# Altium footprint library IC.PCBLIB: 359 footprints (part 6 of 23)
Each footprint in its own frame and in the unit in brackets; x right, y up, seen from the top. Pads: shape width x height; smd on the part's side, far side on the other; paste and mask are expansions set on the pad; w line width, h text height; cw(c..) or ccw(c..) is an arc to the next point about the centre after c.
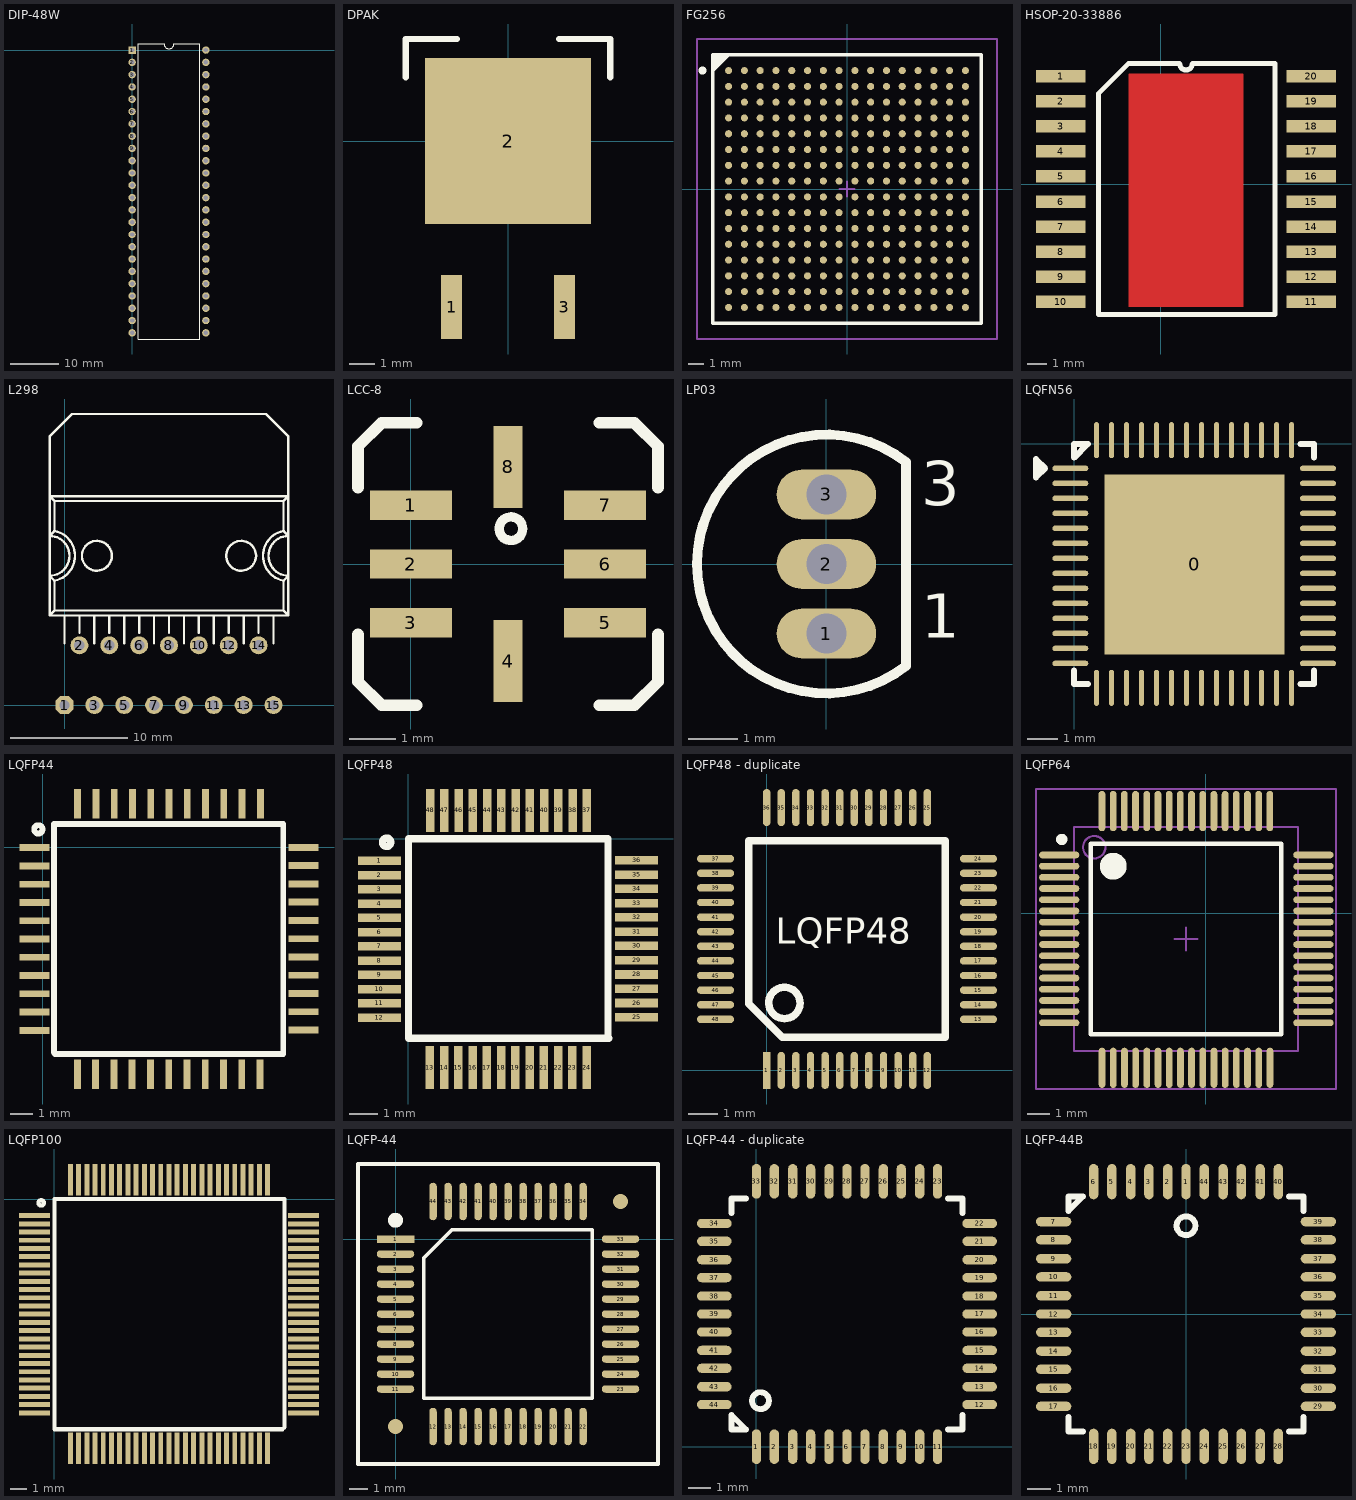
[diagram p5: the footprints below, top view; thin cyan lines are the x and y axes]

## DIP-48W [mil]
pads (48):
  rect 60x60 hole 35: 1(0,0)
  round 60 hole 35: 2(0,-100) 3(0,-200) 4(0,-300) 5(0,-400) 6(0,-500) 7(0,-600) 8(0,-700) 9(0,-800) 10(0,-900) 11(0,-1000) 12(0,-1100) 13(0,-1200) 14(0,-1300) 15(0,-1400) 16(0,-1500) 17(0,-1600) 18(0,-1700) 19(0,-1800) 20(0,-1900) 21(0,-2000) 22(0,-2100) 23(0,-2200) 24(0,-2300) 25(600,-2300) 26(600,-2200) 27(600,-2100) 28(600,-2000) 29(600,-1900) 30(600,-1800) 31(600,-1700) 32(600,-1600) 33(600,-1500) 34(600,-1400) 35(600,-1300) 36(600,-1200) 37(600,-1100) 38(600,-1000) 39(600,-900) 40(600,-800) 41(600,-700) 42(600,-600) 43(600,-500) 44(600,-400) 45(600,-300) 46(600,-200) 47(600,-100) 48(600,0)
TopOverlay:
  lines w10: 50,-2350 50,50 260,50 ccw(c300,50) 340,50 550,50 550,-2350 50,-2350

## DPAK [mil]
pads (3):
  rect 33x100 smd: 1(-88.5,-260) 3(88.5,-260)
  rect 260x260 smd: 2(0,0)
TopOverlay:
  lines w10: -160,100 -160,160 -80,160 ; 80,160 160,160 160,100

## FG256 [mm] "BGA, 256-Leads, Body 17x17mm, Pitch 1mm"
height 1.97
pads (256):
  round 0.45 smd: A1(-7.5,7.5) A2(-6.5,7.5) A3(-5.5,7.5) A4(-4.5,7.5) A5(-3.5,7.5) A6(-2.5,7.5) A7(-1.5,7.5) A8(-0.5,7.5) A9(0.5,7.5) A10(1.5,7.5) A11(2.5,7.5) A12(3.5,7.5) A13(4.5,7.5) A14(5.5,7.5) A15(6.5,7.5) A16(7.5,7.5) B1(-7.5,6.5) B2(-6.5,6.5) B3(-5.5,6.5) B4(-4.5,6.5) B5(-3.5,6.5) B6(-2.5,6.5) B7(-1.5,6.5) B8(-0.5,6.5) B9(0.5,6.5) B10(1.5,6.5) B11(2.5,6.5) B12(3.5,6.5) B13(4.5,6.5) B14(5.5,6.5) B15(6.5,6.5) B16(7.5,6.5) C1(-7.5,5.5) C2(-6.5,5.5) C3(-5.5,5.5) C4(-4.5,5.5) C5(-3.5,5.5) C6(-2.5,5.5) C7(-1.5,5.5) C8(-0.5,5.5) C9(0.5,5.5) C10(1.5,5.5) C11(2.5,5.5) C12(3.5,5.5) C13(4.5,5.5) C14(5.5,5.5) C15(6.5,5.5) C16(7.5,5.5) D1(-7.5,4.5) D2(-6.5,4.5) D3(-5.5,4.5) D4(-4.5,4.5) D5(-3.5,4.5) D6(-2.5,4.5) D7(-1.5,4.5) D8(-0.5,4.5) D9(0.5,4.5) D10(1.5,4.5) D11(2.5,4.5) D12(3.5,4.5) D13(4.5,4.5) D14(5.5,4.5) D15(6.5,4.5) D16(7.5,4.5) E1(-7.5,3.5) E2(-6.5,3.5) E3(-5.5,3.5) E4(-4.5,3.5) E5(-3.5,3.5) E6(-2.5,3.5) E7(-1.5,3.5) E8(-0.5,3.5) E9(0.5,3.5) E10(1.5,3.5) E11(2.5,3.5) E12(3.5,3.5) E13(4.5,3.5) E14(5.5,3.5) E15(6.5,3.5) E16(7.5,3.5) F1(-7.5,2.5) F2(-6.5,2.5) F3(-5.5,2.5) F4(-4.5,2.5) F5(-3.5,2.5) F6(-2.5,2.5) F7(-1.5,2.5) F8(-0.5,2.5) F9(0.5,2.5) F10(1.5,2.5) F11(2.5,2.5) F12(3.5,2.5) F13(4.5,2.5) F14(5.5,2.5) F15(6.5,2.5) F16(7.5,2.5) G1(-7.5,1.5) G2(-6.5,1.5) G3(-5.5,1.5) G4(-4.5,1.5) G5(-3.5,1.5) G6(-2.5,1.5) G7(-1.5,1.5) G8(-0.5,1.5) G9(0.5,1.5) G10(1.5,1.5) G11(2.5,1.5) G12(3.5,1.5) G13(4.5,1.5) G14(5.5,1.5) G15(6.5,1.5) G16(7.5,1.5) H1(-7.5,0.5) H2(-6.5,0.5) H3(-5.5,0.5) H4(-4.5,0.5) H5(-3.5,0.5) H6(-2.5,0.5) H7(-1.5,0.5) H8(-0.5,0.5) H9(0.5,0.5) H10(1.5,0.5) H11(2.5,0.5) H12(3.5,0.5) H13(4.5,0.5) H14(5.5,0.5) H15(6.5,0.5) H16(7.5,0.5) J1(-7.5,-0.5) J2(-6.5,-0.5) J3(-5.5,-0.5) J4(-4.5,-0.5) J5(-3.5,-0.5) J6(-2.5,-0.5) J7(-1.5,-0.5) J8(-0.5,-0.5) J9(0.5,-0.5) J10(1.5,-0.5) J11(2.5,-0.5) J12(3.5,-0.5) J13(4.5,-0.5) J14(5.5,-0.5) J15(6.5,-0.5) J16(7.5,-0.5) K1(-7.5,-1.5) K2(-6.5,-1.5) K3(-5.5,-1.5) K4(-4.5,-1.5) K5(-3.5,-1.5) K6(-2.5,-1.5) K7(-1.5,-1.5) K8(-0.5,-1.5) K9(0.5,-1.5) K10(1.5,-1.5) K11(2.5,-1.5) K12(3.5,-1.5) K13(4.5,-1.5) K14(5.5,-1.5) K15(6.5,-1.5) K16(7.5,-1.5) L1(-7.5,-2.5) L2(-6.5,-2.5) L3(-5.5,-2.5) L4(-4.5,-2.5) L5(-3.5,-2.5) L6(-2.5,-2.5) L7(-1.5,-2.5) L8(-0.5,-2.5) L9(0.5,-2.5) L10(1.5,-2.5) L11(2.5,-2.5) L12(3.5,-2.5) L13(4.5,-2.5) L14(5.5,-2.5) L15(6.5,-2.5) L16(7.5,-2.5) M1(-7.5,-3.5) M2(-6.5,-3.5) M3(-5.5,-3.5) M4(-4.5,-3.5) M5(-3.5,-3.5) M6(-2.5,-3.5) M7(-1.5,-3.5) M8(-0.5,-3.5) M9(0.5,-3.5) M10(1.5,-3.5) M11(2.5,-3.5) M12(3.5,-3.5) M13(4.5,-3.5) M14(5.5,-3.5) M15(6.5,-3.5) M16(7.5,-3.5) N1(-7.5,-4.5) N2(-6.5,-4.5) N3(-5.5,-4.5) N4(-4.5,-4.5) N5(-3.5,-4.5) N6(-2.5,-4.5) N7(-1.5,-4.5) N8(-0.5,-4.5) N9(0.5,-4.5) N10(1.5,-4.5) N11(2.5,-4.5) N12(3.5,-4.5) N13(4.5,-4.5) N14(5.5,-4.5) N15(6.5,-4.5) N16(7.5,-4.5) P1(-7.5,-5.5) P2(-6.5,-5.5) P3(-5.5,-5.5) P4(-4.5,-5.5) P5(-3.5,-5.5) P6(-2.5,-5.5) P7(-1.5,-5.5) P8(-0.5,-5.5) P9(0.5,-5.5) P10(1.5,-5.5) P11(2.5,-5.5) P12(3.5,-5.5) P13(4.5,-5.5) P14(5.5,-5.5) P15(6.5,-5.5) P16(7.5,-5.5) R1(-7.5,-6.5) R2(-6.5,-6.5) R3(-5.5,-6.5) R4(-4.5,-6.5) R5(-3.5,-6.5) R6(-2.5,-6.5) R7(-1.5,-6.5) R8(-0.5,-6.5) R9(0.5,-6.5) R10(1.5,-6.5) R11(2.5,-6.5) R12(3.5,-6.5) R13(4.5,-6.5) R14(5.5,-6.5) R15(6.5,-6.5) R16(7.5,-6.5) T1(-7.5,-7.5) T2(-6.5,-7.5) T3(-5.5,-7.5) T4(-4.5,-7.5) T5(-3.5,-7.5) T6(-2.5,-7.5) T7(-1.5,-7.5) T8(-0.5,-7.5) T9(0.5,-7.5) T10(1.5,-7.5) T11(2.5,-7.5) T12(3.5,-7.5) T13(4.5,-7.5) T14(5.5,-7.5) T15(6.5,-7.5) T16(7.5,-7.5)
TopOverlay:
  circle w0.25: c-9.15,7.5 r0.125
  region: -7.5,8.5 -8.5,7.5 -8.5,8.5
  lines w0.2: -8.5,7.5 -7.5,8.5 ; -8.5,-8.5 8.5,-8.5 8.5,8.5 -8.5,8.5 -8.5,-8.5
Mechanical13:
  lines w0.1: -8.5,-8.5 8.5,-8.5 8.5,8.5 -8.5,8.5 -8.5,-8.5
Mechanical15:
  lines w0.1: -0.5,0 0.5,0 ; 0,-0.5 0,0.5 ; -9.5,-9.5 9.5,-9.5 9.5,9.5 -9.5,9.5 -9.5,-9.5
3D body: height 1.97, standoff 0, extent -8.5,-8.5 8.5,8.5

## HSOP-20-33886 [mm]
pads (20):
  rect 2.5x0.635 smd: 1(-5.08,5.465) 2(-5.08,4.195) 3(-5.08,2.925) 4(-5.08,1.655) 5(-5.08,0.385) 6(-5.08,-0.885) 7(-5.08,-2.155) 8(-5.08,-3.425) 9(-5.08,-4.695) 10(-5.08,-5.965) 11(7.62,-5.965) 12(7.62,-4.695) 13(7.62,-3.425) 14(7.62,-2.155) 15(7.62,-0.885) 16(7.62,0.385) 17(7.62,1.655) 18(7.62,2.925) 19(7.62,4.195) 20(7.62,5.465)
TopLayer:
  rectangle: -1.651,-6.219 4.191,5.592
TopOverlay:
  lines w0.254: -3.175,-6.6 -3.175,4.576 -1.651,6.1 0.953,6.1 ccw(c1.27,6.1) 1.587,6.1 5.779,6.1 5.779,-6.6 -3.175,-6.6

## L298 [mil] "L298"
height 10
pads (15):
  oct 60x60 hole 35: 1(0,0)
  round 60 hole 35: 2(50,200) 3(100,0) 4(150,200) 5(200,0) 6(250,200) 7(300,0) 8(350,200) 9(400,0) 10(450,200) 11(500,0) 12(550,200) 13(600,0) 14(650,200) 15(700,0)
TopOverlay:
  circle w8: c108.33,500 r50
  circle w8: c591.67,500 r50
  lines w7.87: -50,433.33 -33.33,416.67 -33.33,316.67 ; -50,566.67 -33.33,583.33 -33.33,683.33 ; 0,207.48 0,300 ; 50,241.67 50,300 ; 100,207.48 100,300 ; 150,241.67 150,300 ; 200,207.48 200,300 ; 250,241.67 250,300 ; 300,207.48 300,300 ; 350,241.67 350,300 ; 400,207.48 400,300 ; 450,241.67 450,300 ; 500,207.48 500,300 ; 550,241.67 550,300 ; 600,207.48 600,300 ; 650,241.67 650,300 ; 700,207.48 700,300 ; 750,433.33 733.33,416.67 733.33,316.67 ; 750,566.67 733.33,583.33 733.33,683.33 ; -50,300 -50,700 ; -50,300 750,300 ; -50,300 -33.33,316.67 ; -50,700 -50,900 25,975 675,975 750,900 750,700 ; -50,700 750,700 ; -50,700 -33.33,683.33 ; -33.33,316.67 733.33,316.67 ; -33.33,683.33 733.33,683.33 ; 733.33,316.67 750,300 ; 733.33,683.33 750,700 ; 750,300 750,700
  lines w8: -50,433.33 ccw(c-50,500) -50,566.67 ; -33.78,416.56 ccw(c-50,500) -33.78,583.44 ; 733.78,416.56 cw(c750,500) 733.78,583.44 ; 750,433.33 cw(c750,500) 750,566.67

## LCC-8 [mil]
pads (8):
  rect 70x25 smd: 1(0,50) 2(0,0) 3(0,-50) 5(165,-50) 6(165,0) 7(165,50)
  rect 25x70 smd: 4(82.5,-82.5) 8(82.5,82.5)
TopOverlay:
  circle w8: c85,30 r10
  lines w10: -45,-60 -45,-100 -25,-120 5,-120 ; -45,65 -45,100 -25,120 5,120 ; 160,-120 190,-120 210,-100 210,-60 ; 160,120 190,120 210,100 210,65

## LP03 [mm] "TO, Flat Index; 3 In-Line, Axial Leads; Body Dia. 4.8mm; Leads 0.56 x 0.41 mm (max)"
height 5.34
pads (3):
  oval 2x1 hole 0.8: 1(0,-1.397) 2(0,0) 3(0,1.397)
TopOverlay:
  lines w0.2: 1.601,-2.049 cw(c0,0) 1.601,2.049 ; 1.6,-1.99 1.6,1.99
  text "3" at 1.905,0.889 h1.52
  text "1" at 1.905,-1.778 h1.52

## LQFN56 [mm]
pads (57):
  rect 6x6 smd: 0(4.013,-4.013)
  oval 1.2x0.18 smd: 1(-0.127,-0.813) 2(-0.127,-1.313) 3(-0.127,-1.813) 4(-0.127,-2.313) 5(-0.127,-2.813) 6(-0.127,-3.313) 7(-0.127,-3.813) 8(-0.127,-4.313) 9(-0.127,-4.813) 10(-0.127,-5.313) 11(-0.127,-5.813) 12(-0.127,-6.313) 13(-0.127,-6.813) 14(-0.127,-7.313) 29(8.128,-7.313) 30(8.128,-6.813) 31(8.128,-6.313) 32(8.128,-5.813) 33(8.128,-5.313) 34(8.128,-4.813) 35(8.128,-4.313) 36(8.128,-3.813) 37(8.128,-3.313) 38(8.128,-2.813) 39(8.128,-2.313) 40(8.128,-1.813) 41(8.128,-1.313) 42(8.128,-0.813)
  oval 0.18x1.2 smd: 15(0.746,-8.128) 16(1.246,-8.128) 17(1.746,-8.128) 18(2.246,-8.128) 19(2.746,-8.128) 20(3.246,-8.128) 21(3.746,-8.128) 22(4.246,-8.128) 23(4.746,-8.128) 24(5.246,-8.128) 25(5.746,-8.128) 26(6.246,-8.128) 27(6.746,-8.128) 28(7.246,-8.128) 43(7.246,0.127) 44(6.746,0.127) 45(6.246,0.127) 46(5.746,0.127) 47(5.246,0.127) 48(4.746,0.127) 49(4.246,0.127) 50(3.746,0.127) 51(3.246,0.127) 52(2.746,0.127) 53(2.246,0.127) 54(1.746,0.127) 55(1.246,0.127) 56(0.746,0.127)
TopOverlay:
  lines w0.203: -1.27,-0.813 -0.965,-0.813 ; 0,-7.544 0,-8.001 0.457,-8.001 ; 7.544,-8.001 8.001,-8.001 8.001,-7.544 ; 7.544,0 8.001,0 8.001,-0.457 ; -0.965,-0.813 -1.27,-0.508 -1.27,-1.118 -0.965,-0.813 ; 0,-0.457 0.457,0 0,0 0,-0.457

## LQFP44 [mm]
pads (44):
  rect 1.3x0.3 smd: 1(-0.356,-0.013) 2(-0.356,-0.813) 3(-0.356,-1.613) 4(-0.356,-2.413) 5(-0.356,-3.213) 6(-0.356,-4.013) 7(-0.356,-4.813) 8(-0.356,-5.613) 9(-0.356,-6.413) 10(-0.356,-7.213) 11(-0.356,-8.013) 23(11.43,-8) 24(11.43,-7.2) 25(11.43,-6.4) 26(11.43,-5.6) 27(11.43,-4.8) 28(11.43,-4) 29(11.43,-3.2) 30(11.43,-2.4) 31(11.43,-1.6) 32(11.43,-0.8) 33(11.43,0)
  rect 0.3x1.3 smd: 12(1.524,-9.931) 13(2.324,-9.931) 14(3.124,-9.931) 15(3.924,-9.931) 16(4.724,-9.931) 17(5.524,-9.931) 18(6.324,-9.931) 19(7.124,-9.931) 20(7.924,-9.931) 21(8.724,-9.931) 22(9.524,-9.931) 34(9.537,1.905) 35(8.737,1.905) 36(7.937,1.905) 37(7.137,1.905) 38(6.337,1.905) 39(5.537,1.905) 40(4.737,1.905) 41(3.937,1.905) 42(3.137,1.905) 43(2.337,1.905) 44(1.537,1.905)
TopOverlay:
  circle w0.254: c-0.183,0.787 r0.183
  lines w0.254: 0.508,-8.984 0.508,1.016 ; 0.541,-9.042 10.541,-9.042 ; 0.541,1.016 10.541,1.016 10.541,-8.984

## LQFP48 [mm]
pads (48):
  rect 1.5x0.3 smd: 1(-1.016,-0.778) 2(-1.016,-1.278) 3(-1.016,-1.778) 4(-1.016,-2.278) 5(-1.016,-2.778) 6(-1.016,-3.278) 7(-1.016,-3.778) 8(-1.016,-4.278) 9(-1.016,-4.778) 10(-1.016,-5.278) 11(-1.016,-5.778) 12(-1.016,-6.278) 25(8.001,-6.262) 26(8.001,-5.762) 27(8.001,-5.262) 28(8.001,-4.762) 29(8.001,-4.262) 30(8.001,-3.762) 31(8.001,-3.262) 32(8.001,-2.762) 33(8.001,-2.262) 34(8.001,-1.762) 35(8.001,-1.262) 36(8.001,-0.762)
  rect 0.3x1.5 smd: 13(0.751,-8.026) 14(1.251,-8.026) 15(1.751,-8.026) 16(2.251,-8.026) 17(2.751,-8.026) 18(3.251,-8.026) 19(3.751,-8.026) 20(4.251,-8.026) 21(4.751,-8.026) 22(5.251,-8.026) 23(5.751,-8.026) 24(6.251,-8.026) 37(6.259,0.991) 38(5.759,0.991) 39(5.259,0.991) 40(4.759,0.991) 41(4.259,0.991) 42(3.759,0.991) 43(3.259,0.991) 44(2.759,0.991) 45(2.259,0.991) 46(1.759,0.991) 47(1.259,0.991) 48(0.759,0.991)
TopOverlay:
  circle w0.254: c-0.762,-0.127 r0.148
  lines w0.254: 7,-6.975 7,0 0,0 0,-7 7.025,-7

## LQFP48 - duplicate [mm]
pads (48):
  rect 0.254x1.27 smd: 1(0,0)
  oval 0.254x1.27 smd: 2(0.5,0) 3(1,0) 4(1.5,0) 5(2,0) 6(2.5,0) 7(3,0) 8(3.5,0) 9(4,0) 10(4.5,0) 11(5,0) 12(5.5,0) 25(5.5,9) 26(5,9) 27(4.5,9) 28(4,9) 29(3.5,9) 30(3,9) 31(2.5,9) 32(2,9) 33(1.5,9) 34(1,9) 35(0.5,9) 36(0,9)
  oval 1.27x0.254 smd: 13(7.25,1.75) 14(7.25,2.25) 15(7.25,2.75) 16(7.25,3.25) 17(7.25,3.75) 18(7.25,4.25) 19(7.25,4.75) 20(7.25,5.25) 21(7.25,5.75) 22(7.25,6.25) 23(7.25,6.75) 24(7.25,7.25) 37(-1.75,7.25) 38(-1.75,6.75) 39(-1.75,6.25) 40(-1.75,5.75) 41(-1.75,5.25) 42(-1.75,4.75) 43(-1.75,4.25) 44(-1.75,3.75) 45(-1.75,3.25) 46(-1.75,2.75) 47(-1.75,2.25) 48(-1.75,1.75)
TopOverlay:
  lines w0.254: 0.471,2.829 ccw(c0.607,2.311) 0.559,2.845 ; -0.607,2.286 -0.607,7.857 6.107,7.857 6.107,1.143 0.536,1.143 -0.607,2.286
  text "LQFP48" at 0.305,4.343 h0.89

## LQFP64 [mm]
pads (64):
  oval 1.8x0.3 smd: 1(-6.553,2.611) 2(-6.553,2.111) 3(-6.553,1.611) 4(-6.553,1.111) 5(-6.553,0.611) 6(-6.553,0.111) 7(-6.553,-0.389) 8(-6.553,-0.889) 9(-6.553,-1.389) 10(-6.553,-1.889) 11(-6.553,-2.389) 12(-6.553,-2.889) 13(-6.553,-3.389) 14(-6.553,-3.889) 15(-6.553,-4.389) 16(-6.553,-4.889) 33(4.801,-4.889) 34(4.801,-4.389) 35(4.801,-3.889) 36(4.801,-3.389) 37(4.801,-2.889) 38(4.801,-2.389) 39(4.801,-1.889) 40(4.801,-1.389) 41(4.801,-0.889) 42(4.801,-0.389) 43(4.801,0.111) 44(4.801,0.611) 45(4.801,1.111) 46(4.801,1.611) 47(4.801,2.111) 48(4.801,2.611)
  oval 0.3x1.8 smd: 17(-4.639,-6.896) 18(-4.139,-6.896) 19(-3.639,-6.896) 20(-3.139,-6.896) 21(-2.639,-6.896) 22(-2.139,-6.896) 23(-1.639,-6.896) 24(-1.139,-6.896) 25(-0.639,-6.896) 26(-0.139,-6.896) 27(0.361,-6.896) 28(0.861,-6.896) 29(1.361,-6.896) 30(1.861,-6.896) 31(2.361,-6.896) 32(2.861,-6.896) 49(2.857,4.572) 50(2.357,4.572) 51(1.857,4.572) 52(1.357,4.572) 53(0.857,4.572) 54(0.357,4.572) 55(-0.143,4.572) 56(-0.643,4.572) 57(-1.143,4.572) 58(-1.643,4.572) 59(-2.143,4.572) 60(-2.643,4.572) 61(-3.143,4.572) 62(-3.643,4.572) 63(-4.143,4.572) 64(-4.643,4.572)
TopOverlay:
  circle w0.25: c-6.439,3.307 r0.125
  circle w0.6: c-4.139,2.107 r0.3
  lines w0.2: -5.139,-5.393 -5.139,3.107 3.361,3.107 3.361,-5.393 -5.139,-5.393
Mechanical13:
  circle w0.1: c-4.989,2.957 r0.5
  lines w0.1: -5.889,-6.143 -5.889,3.857 4.111,3.857 4.111,-6.143 -5.889,-6.143
Mechanical15:
  lines w0.1: -1.389,-1.143 -0.389,-1.143 ; -0.889,-1.643 -0.889,-0.643 ; -7.589,-7.843 -7.589,5.557 5.811,5.557 5.811,-7.843 -7.589,-7.843

## LQFP100 [mm]
pads (100):
  rect 1.9x0.3 smd: 1(-1.2,-1) 2(-1.2,-1.5) 3(-1.2,-2) 4(-1.2,-2.5) 5(-1.2,-3) 6(-1.2,-3.5) 7(-1.2,-4) 8(-1.2,-4.5) 9(-1.2,-5) 10(-1.2,-5.5) 11(-1.2,-6) 12(-1.2,-6.5) 13(-1.2,-7) 14(-1.2,-7.5) 15(-1.2,-8) 16(-1.2,-8.5) 17(-1.2,-9) 18(-1.2,-9.5) 19(-1.2,-10) 20(-1.2,-10.5) 21(-1.2,-11) 22(-1.2,-11.5) 23(-1.2,-12) 24(-1.2,-12.5) 25(-1.2,-13) 51(15.15,-13) 52(15.15,-12.5) 53(15.15,-12) 54(15.15,-11.5) 55(15.15,-11) 56(15.15,-10.5) 57(15.15,-10) 58(15.15,-9.5) 59(15.15,-9) 60(15.15,-8.5) 61(15.15,-8) 62(15.15,-7.5) 63(15.15,-7) 64(15.15,-6.5) 65(15.15,-6) 66(15.15,-5.5) 67(15.15,-5) 68(15.15,-4.5) 69(15.15,-4) 70(15.15,-3.5) 71(15.15,-3) 72(15.15,-2.5) 73(15.15,-2) 74(15.15,-1.5) 75(15.15,-1)
  rect 0.3x1.9 smd: 26(0.975,-15.15) 27(1.475,-15.15) 28(1.975,-15.15) 29(2.475,-15.15) 30(2.975,-15.15) 31(3.475,-15.15) 32(3.975,-15.15) 33(4.475,-15.15) 34(4.975,-15.15) 35(5.475,-15.15) 36(5.975,-15.15) 37(6.475,-15.15) 38(6.975,-15.15) 39(7.475,-15.15) 40(7.975,-15.15) 41(8.475,-15.15) 42(8.975,-15.15) 43(9.475,-15.15) 44(9.975,-15.15) 45(10.475,-15.15) 46(10.975,-15.15) 47(11.475,-15.15) 48(11.975,-15.15) 49(12.475,-15.15) 50(12.975,-15.15) 76(12.974,1.175) 77(12.474,1.175) 78(11.974,1.175) 79(11.474,1.175) 80(10.974,1.175) 81(10.474,1.175) 82(9.974,1.175) 83(9.474,1.175) 84(8.974,1.175) 85(8.474,1.175) 86(7.974,1.175) 87(7.474,1.175) 88(6.974,1.175) 89(6.474,1.175) 90(5.974,1.175) 91(5.474,1.175) 92(4.974,1.175) 93(4.474,1.175) 94(3.974,1.175) 95(3.474,1.175) 96(2.974,1.175) 97(2.474,1.175) 98(1.974,1.175) 99(1.474,1.175) 100(0.974,1.175)
TopOverlay:
  circle w0.254: c-0.798,-0.229 r0.163
  lines w0.254: 13.873,-14 0,-14 0,0 14,0 14,-13.873

## LQFP-44 [mm]
pads (46):
  rect 2x0.4 smd: 1(0,0)
  oval 2x0.4 smd: 2(0,-0.8) 3(0,-1.6) 4(0,-2.4) 5(0,-3.2) 6(0,-4) 7(0,-4.8) 8(0,-5.6) 9(0,-6.4) 10(0,-7.2) 11(0,-8) 23(12,-8) 24(12,-7.2) 25(12,-6.4) 26(12,-5.6) 27(12,-4.8) 28(12,-4) 29(12,-3.2) 30(12,-2.4) 31(12,-1.6) 32(12,-0.8) 33(12,0)
  oval 0.4x2 smd: 12(2,-10) 13(2.8,-10) 14(3.6,-10) 15(4.4,-10) 16(5.2,-10) 17(6,-10) 18(6.8,-10) 19(7.6,-10) 20(8.4,-10) 21(9.2,-10) 22(10,-10) 34(10,2) 35(9.2,2) 36(8.4,2) 37(7.6,2) 38(6.8,2) 39(6,2) 40(5.2,2) 41(4.4,2) 42(3.6,2) 43(2.8,2) 44(2,2)
  round 0.8 smd: ""(0,-10) ""(12,2)
TopOverlay:
  circle w0.4: c0,1 r0.2
  lines w0.2: -2,-12 -2,4 14,4 14,-12 -2,-12 ; 1.508,-8.492 10.492,-8.492 10.492,0.492 3.016,0.492 1.508,-1.016 1.508,-8.492

## LQFP-44 - duplicate [mil]
pads (44):
  oval 16x60 smd: 1(0,0) 2(31,0) 3(63,0) 4(94,0) 5(126,0) 6(157,0) 7(188,0) 8(220,0) 9(251,0) 10(283,0) 11(314,0) 23(314,460) 24(283,460) 25(251,460) 26(220,460) 27(188,460) 28(157,460) 29(126,460) 30(94,460) 31(63,460) 32(31,460) 33(0,460)
  oval 60x16 smd: 12(387,73) 13(387,104) 14(387,136) 15(387,167) 16(387,199) 17(387,230) 18(387,261) 19(387,293) 20(387,324) 21(387,356) 22(387,387) 34(-73,387) 35(-73,356) 36(-73,324) 37(-73,293) 38(-73,261) 39(-73,230) 40(-73,199) 41(-73,167) 42(-73,136) 43(-73,104) 44(-73,73)
TopOverlay:
  circle w10: c7,79.72 r14.72
  lines w10: -43,405 -43,430 -18,430 ; 332,30 357,30 357,55 ; 332,430 357,430 357,405 ; -43,30 -18,30 -43,55 -43,30

## LQFP-44B [mil]
pads (44):
  oval 16x60 smd: 1(0,225) 2(-31,225) 3(-63,225) 4(-94,225) 5(-126,225) 6(-157,225) 18(-157,-225) 19(-126,-225) 20(-94,-225) 21(-63,-225) 22(-31,-225) 23(0,-225) 24(31,-225) 25(63,-225) 26(94,-225) 27(126,-225) 28(157,-225) 40(157,225) 41(126,225) 42(94,225) 43(63,225) 44(31,225)
  oval 60x16 smd: 7(-225,157) 8(-225,126) 9(-225,94) 10(-225,63) 11(-225,31) 12(-225,0) 13(-225,-31) 14(-225,-63) 15(-225,-94) 16(-225,-126) 17(-225,-157) 29(225,-157) 30(225,-126) 31(225,-94) 32(225,-63) 33(225,-31) 34(225,0) 35(225,31) 36(225,63) 37(225,94) 38(225,126) 39(225,157)
TopOverlay:
  circle w10: c0,150 r16
  lines w10: -200,-175 -200,-200 -175,-200 ; 175,-200 200,-200 200,-175 ; 175,200 200,200 200,175 ; -200,175 -200,200 -175,200 -200,175